# Altium footprint library 2.52-直插元件.PcbLib: 163 footprints (part 11 of 11)
Each footprint in its own frame and in the unit in brackets; x right, y up, seen from the top. Pads: shape width x height; smd on the part's side, far side on the other; paste and mask are expansions set on the pad; w line width, h text height; cw(c..) or ccw(c..) is an arc to the next point about the centre after c.
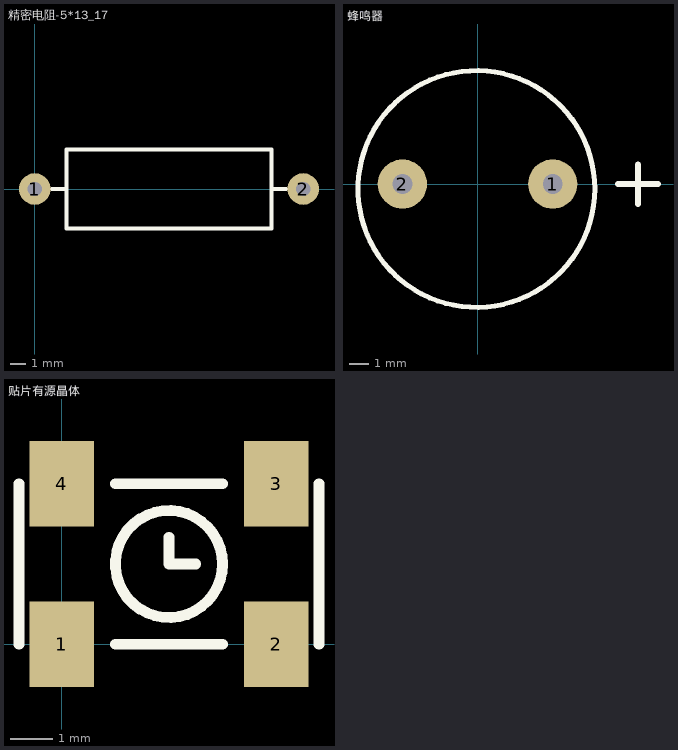
[diagram p10: the footprints below, top view; thin cyan lines are the x and y axes]

## 精密电阻-5*13_17 [mm]
pads (2):
  round 2 hole 0.9: 1(0,0) 2(17,0)
Top Overlay:
  lines w0.254: 1.1,0 2,0 ; 15,0 15.9,0 ; 2,-2.5 2,2.5 15,2.5 15,-2.5 2,-2.5

## 蜂鸣器 [mm] "淘宝ID:黄晶宝石"
pads (2):
  round 2.5 hole 1: 1(3.81,0) 2(-3.81,0)
Top Overlay:
  circle w0.254: c-0.06,-0.25 r6
  lines w0.305: 7.112,0 9.144,0 ; 8.128,-1 8.128,1

## 贴片有源晶体 [mil] "淘宝ID:黄晶宝石"
pads (4):
  rect 60x80 smd: 1(0,0) 2(200,0) 3(200,150) 4(0,150)
Top Overlay:
  circle w10: c100,75 r50
  lines w10: -40,0 -40,150 ; 50,0 150,0 ; 50,150 150,150 ; 100,100 100,75 125,75 ; 240,0 240,150
3D body "User Library-VX3-Quartz-Oscillator.STEP": height 73.62, standoff 10.63, extent -37.5,-23.43 238.09,173.43